# Altium footprint library HyTechManufacturing.PCBLIB: 24 footprints (part 1 of 2)
Each footprint in its own frame and in the unit in brackets; x right, y up, seen from the top. Pads: shape width x height; smd on the part's side, far side on the other; paste and mask are expansions set on the pad; w line width, h text height; cw(c..) or ccw(c..) is an arc to the next point about the centre after c.
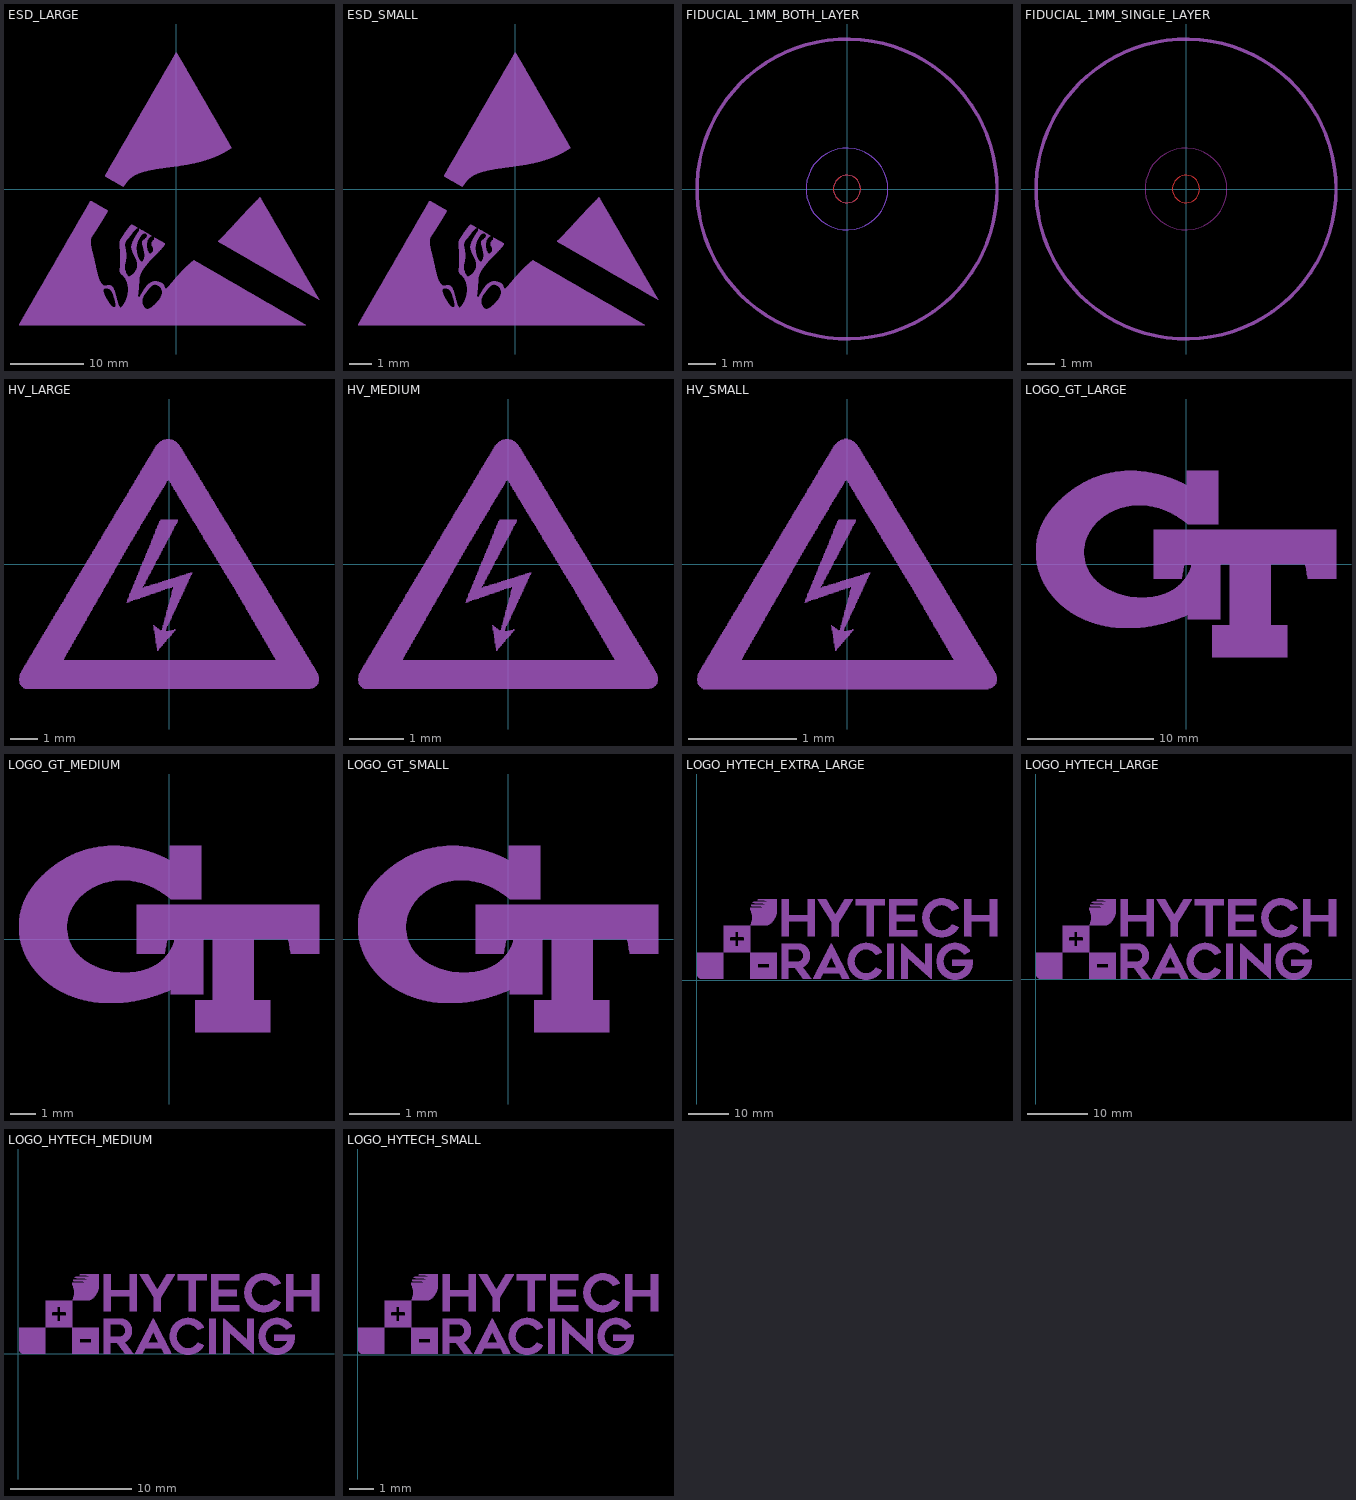
[diagram p0: the footprints below, top view; thin cyan lines are the x and y axes]

## DANGER_HIGH_VOLTAGE [mm]
tPlace:
  text "DANGER HIGH VOLTAGE" at 0,0 h1.73
bPlace:
  text "DANGER HIGH VOLTAGE" at 0,0 h1.73

## ESD_LARGE [mm]
tPlace:
  drawing of 3358 lines, arcs and shapes, not listed

## ESD_SMALL [mm]
tPlace:
  drawing of 3358 lines, arcs and shapes, not listed

## FIDUCIAL_1MM_BOTH_LAYER [mm]
Top:
  circle w0: c0,0 r0.5
Top keep-out:
  circle w0: c0,0 r1.5
  circle w0: c0,0 r1.5
  circle w0: c0,0 r1.5
Bottom:
  circle w0: c0,0 r0.5
Bottom keep-out:
  circle w0: c0,0 r1.5
  circle w0: c0,0 r1.5
  circle w0: c0,0 r1.5
Top Solder:
  circle w0: c0,0 r1
Bottom Solder:
  circle w0: c0,0 r1
tDocu:
  circle w0.127: c0,0 r5.5

## FIDUCIAL_1MM_SINGLE_LAYER [mm]
Top:
  circle w0: c0,0 r0.5
Top keep-out:
  circle w0: c0,0 r1.5
  circle w0: c0,0 r1.5
  circle w0: c0,0 r1.5
Top Solder:
  circle w0: c0,0 r1
tDocu:
  circle w0.127: c0,0 r5.5

## GLV [mm]
tPlace:
  text "GLV" at 0,0 h1.73
bPlace:
  text "GLV" at 0,0 h1.73

## HV_LARGE [mm]
tPlace:
  drawing of 878 lines, arcs and shapes, not listed

## HV_MEDIUM [mm]
tPlace:
  drawing of 878 lines, arcs and shapes, not listed

## HV_SMALL [mm]
tPlace:
  drawing of 878 lines, arcs and shapes, not listed

## LOGO_GT_LARGE [mm]
tPlace:
  drawing of 1203 lines, arcs and shapes, not listed

## LOGO_GT_MEDIUM [mm]
tPlace:
  drawing of 1203 lines, arcs and shapes, not listed

## LOGO_GT_SMALL [mm]
tPlace:
  drawing of 1203 lines, arcs and shapes, not listed

## LOGO_HYTECH_EXTRA_LARGE [mm]
tPlace:
  drawing of 2493 lines, arcs and shapes, not listed

## LOGO_HYTECH_LARGE [mm]
tPlace:
  drawing of 2493 lines, arcs and shapes, not listed

## LOGO_HYTECH_MEDIUM [mm]
tPlace:
  drawing of 2493 lines, arcs and shapes, not listed

## LOGO_HYTECH_SMALL [mm]
tPlace:
  drawing of 2493 lines, arcs and shapes, not listed